# Altium footprint library Micro Switch.PcbLib: 75 footprints (part 1 of 5)
Each footprint in its own frame and in the unit in brackets; x right, y up, seen from the top. Pads: shape width x height; smd on the part's side, far side on the other; paste and mask are expansions set on the pad; w line width, h text height; cw(c..) or ccw(c..) is an arc to the next point about the centre after c.
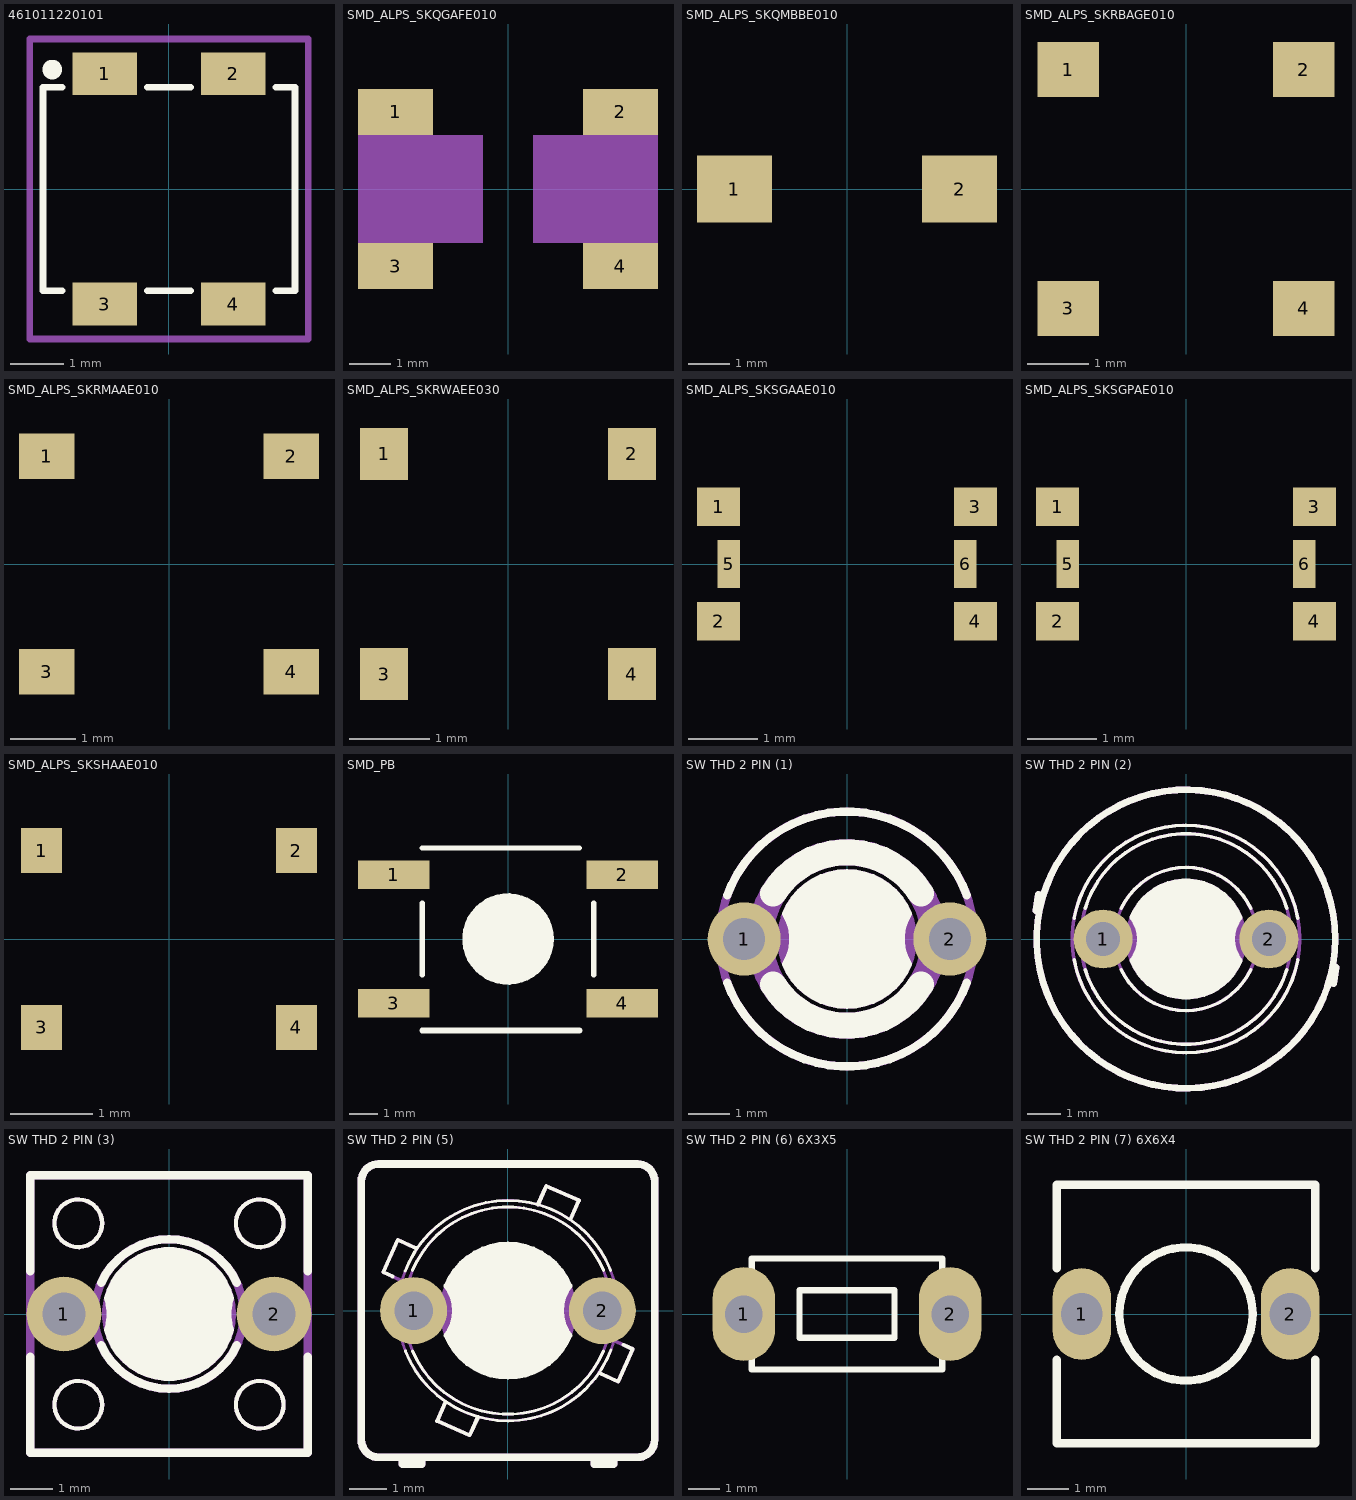
[diagram p0: the footprints below, top view; thin cyan lines are the x and y axes]

## 461011220101 [mm]
height 3.8
pads (4):
  rect 1.2x0.8 smd: 1(-1.2,2.15) 2(1.2,2.15) 3(-1.2,-2.15) 4(1.2,-2.15)
Top Overlay:
  circle w0.3: c-2.18,2.23 r0.032
  lines w0.127: -2,-1.9 -2.35,-1.9 -2.35,1.9 -2,1.9 ; -0.4,-1.9 0.4,-1.9 ; -0.4,1.9 0.4,1.9 ; 2,-1.9 2.35,-1.9 2.35,1.9 2,1.9
Mechanical 15:
  lines w0.127: -2.6,-2.8 2.6,-2.8 2.6,2.8 -2.6,2.8 -2.6,-2.8
3D body "461011220101.stp": height 3.8, standoff 0, extent -2.45,-2.35 2.45,2.35

## SMD_ALPS_SKQGAFE010 [mm]
height 1.5
pads (4):
  rect 1.8x1.1 smd mask-1.27: 1(-2.7,1.85) 2(2.7,1.85) 3(-2.7,-1.85) 4(2.7,-1.85)
Mechanical 9:
  rectangle: -3.6,-1.3 -0.6,1.3
  region: 3.6,1.3 0.6,1.3 0.6,-1.3 3.6,-1.3
3D body "SKQGAF.STEP": height 1.53, standoff 0.03, extent -3.2,-2.6 3.2,2.6

## SMD_ALPS_SKQMBBE010 [mm]
height 5
pads (2):
  rect 1.8x1.6 smd mask-1.27: 1(-2.7,0) 2(2.7,0)
3D body "SKQMBB.STEP": height 5.03, standoff 0.03, extent -3.15,-1.75 3.15,1.75

## SMD_ALPS_SKRBAGE010 [mm]
height 0.55
pads (4):
  rect 1x0.9 smd mask-1.27: 1(-1.925,1.95) 2(1.925,1.95) 3(-1.925,-1.95) 4(1.925,-1.95)
3D body "SKRBAG.STEP": height 0.55, standoff 0, extent -2.4,-2.4 2.4,2.4

## SMD_ALPS_SKRMAAE010 [mm]
height 0.4
pads (4):
  rect 0.85x0.7 smd mask-1.27: 1(-1.875,1.65) 2(1.875,1.65) 3(-1.875,-1.65) 4(1.875,-1.65)
3D body "SKRMAA.STEP": height 0.4, standoff 0, extent -2.25,-2.25 2.25,2.25

## SMD_ALPS_SKRWAEE030 [mm]
height 0.35
pads (4):
  rect 0.6x0.65 smd: 1(-1.55,1.375) 2(1.55,1.375) 3(-1.55,-1.375) 4(1.55,-1.375)
3D body "SKRWAE.STEP": height 0.38, standoff 0.03, extent -1.85,-1.85 1.85,1.85

## SMD_ALPS_SKSGAAE010 [mm]
height 1.4
pads (6):
  rect 0.625x0.56 smd: 1(-1.863,0.83) 2(-1.863,-0.83) 3(1.863,0.83) 4(1.863,-0.83)
  rect 0.325x0.7 smd: 5(-1.713,0) 6(1.713,0)
3D body "SKSGAA.STEP": height 1.4, standoff 0, extent -1.75,-1.387 1.75,1.387

## SMD_ALPS_SKSGPAE010 [mm]
height 1.4
pads (6):
  rect 0.625x0.56 smd: 1(-1.863,0.83) 2(-1.863,-0.83) 3(1.863,0.83) 4(1.863,-0.83)
  rect 0.325x0.7 smd: 5(-1.713,0) 6(1.713,0)
3D body "SKSGPA.STEP": height 1.4, standoff 0, extent -1.761,-1.387 1.761,1.387

## SMD_ALPS_SKSHAAE010 [mm]
height 0.379
pads (4):
  rect 0.5x0.55 smd: 1(-1.55,1.075) 2(1.55,1.075) 3(-1.55,-1.075) 4(1.55,-1.075)
3D body "SKSHAA.STEP": height 0.4, standoff 0.03, extent -1.716,-1.48 1.717,1.48

## SMD_PB [mm]
height 5
pads (4):
  rect 2.5x1 smd: 1(-3.992,2.25) 2(3.992,2.25) 3(-3.992,-2.25) 4(3.992,-2.25)
Top Overlay:
  circle w0.2: c0,0 r1.5
  region: 0,-1.5 -0.148,-1.5 -0.438,-1.442 -0.711,-1.329 -0.956,-1.165 -1.165,-0.956 -1.329,-0.711 -1.442,-0.438 -1.5,-0.148 -1.5,0 -1.5,0.148 -1.442,0.438 -1.329,0.711 -1.165,0.956 -0.956,1.165 -0.711,1.329 -0.438,1.442 -0.148,1.5 0,1.5 0.148,1.5 0.438,1.442 0.711,1.329 0.956,1.165 1.165,0.956 1.329,0.711 1.442,0.438 1.5,0.148 1.5,0 1.5,-0.148 1.442,-0.438 1.329,-0.711 1.165,-0.956 0.956,-1.165 0.711,-1.329 0.438,-1.442 0.148,-1.5
  lines w0.178: -2.997,3.175 2.503,3.175
  lines w0.2: -3,-1.25 -3,1.25 ; -2.997,-3.2 2.503,-3.2 ; 3,-1.25 3,1.25
3D body "SW3dPS-switch.STEP": height 5.03, standoff 0.03, extent -4.5,-3 4.5,3

## SW THD 2 PIN (1) [mil]
height 169.29
pads (2):
  round 70 hole 40 mask-50: 1(-98.43,0) 2(98.43,0)
Top Overlay:
  region: -60.35,-24.14 -57.33,-18.54 -53.79,-6.35 -53.79,6.35 -57.33,18.54 -60.35,24.14 -57.95,30.15 -50.87,40.98 -41.8,50.2 -31.08,57.45 -19.15,62.45 -6.47,65 6.47,65 19.15,62.45 31.08,57.45 41.8,50.2 50.87,40.98 57.95,30.15 60.35,24.14 57.33,18.54 53.79,6.35 53.79,-6.35 57.33,-18.54 60.35,-24.14 57.95,-30.15 50.87,-40.98 41.8,-50.2 31.08,-57.45 19.15,-62.45 6.47,-65 -6.47,-65 -19.15,-62.45 -31.08,-57.45 -41.8,-50.2 -50.87,-40.98 -57.95,-30.15
  lines w4: -60.35,-24.14 ccw(c0,0) 60.35,-24.14 cw(c98.43,0) 60.35,24.14 ccw(c0,0) -60.35,24.14 cw(c-98.43,0) -60.35,-24.14
  lines w8: -114.64,-41.69 ccw(c0,0) 114.64,-41.69 ; -114.64,41.69 cw(c0,0) 114.64,41.69
  lines w25: -70.71,-43.46 ccw(c0,0) 70.71,-43.46 ; -70.71,43.46 cw(c0,0) 70.71,43.46
Mechanical 3:
  circle w4: c0,0 r65
  circle w8: c0,0 r121.98
  circle w25: c0,0 r83
  region: 0,-65 -6.4,-65 -18.96,-62.5 -30.79,-57.6 -41.44,-50.49 -50.49,-41.44 -57.6,-30.79 -62.5,-18.96 -65,-6.4 -65,0 -65,6.4 -62.5,18.96 -57.6,30.79 -50.49,41.44 -41.44,50.49 -30.79,57.6 -18.96,62.5 -6.4,65 0,65 6.4,65 18.96,62.5 30.79,57.6 41.44,50.49 50.49,41.44 57.6,30.79 62.5,18.96 65,6.4 65,0 65,-6.4 62.5,-18.96 57.6,-30.79 50.49,-41.44 41.44,-50.49 30.79,-57.6 18.96,-62.5 6.4,-65
3D body "SKRGAA.STEP": height 170.29, standoff -136.8, extent -124.38,-122.01 124.4,122.03

## SW THD 2 PIN (2) [mil]
height 511.81
pads (2):
  round 70 hole 40 mask-50: 1(-98.43,0) 2(98.43,0)
Top Overlay:
  circle w8: c0,0 r177.17
  region: -65.2,-25.7 -63.2,-22.88 -59.93,-16.81 -57.7,-10.28 -56.57,-3.47 -56.56,3.42 -57.69,10.23 -59.91,16.76 -63.18,22.84 -65.17,25.66 -65.11,25.7 -62.54,32.2 -54.94,43.93 -45.17,53.93 -33.62,61.8 -20.74,67.22 -7.04,70 6.94,70 20.64,67.25 33.53,61.84 45.1,53.99 54.88,44.01 62.5,32.29 65.07,25.8 65.2,25.7 63.2,22.88 59.93,16.81 57.7,10.28 56.57,3.47 56.56,-3.42 57.69,-10.23 59.91,-16.76 63.18,-22.84 65.17,-25.66 65.11,-25.7 62.54,-32.2 54.94,-43.93 45.17,-53.93 33.62,-61.8 20.74,-67.22 7.04,-70 -6.94,-70 -20.64,-67.25 -33.53,-61.84 -45.1,-53.99 -54.88,-44.01 -62.5,-32.29 -65.07,-25.8
  lines w4: -132.8,24.28 cw(c0,0) 132.72,24.71 ; -132.72,-24.71 ccw(c0,0) 132.8,-24.28 ; -119.6,36.36 cw(c0,0) 119.56,36.47 ; -119.56,-36.47 ccw(c0,0) 119.6,-36.36 ; -76.92,-36.17 ccw(c0,0) 76.89,-36.24 ; -76.89,36.24 cw(c0,0) 76.92,36.17 ; -65.2,-25.7 ccw(c-98.43,0) -65.17,25.66 ; -65.11,25.7 cw(c0,0) 65.07,25.8 ; -65.07,-25.8 ccw(c0,0) 65.11,-25.7 ; 65.17,-25.66 cw(c98.43,0) 65.2,25.7
  lines w8: -174.02,32.84 -178,33.38 -175.2,53 -170.09,52.31 ; 170.09,-52.31 175.2,-53 178,-33.38 174.02,-32.84
Mechanical 3:
  circle w8: c0,0 r177.17
  circle w4: c0,0 r135
  circle w4: c0,0 r125
  circle w4: c0,0 r85
  circle w4: c0,0 r70
  region: 0,-70 -6.89,-70 -20.42,-67.31 -33.16,-62.03 -44.62,-54.37 -54.37,-44.62 -62.03,-33.16 -67.31,-20.42 -70,-6.89 -70,0 -70,6.89 -67.31,20.42 -62.03,33.16 -54.37,44.62 -44.62,54.37 -33.16,62.03 -20.42,67.31 -6.89,70 0,70 6.89,70 20.42,67.31 33.16,62.03 44.62,54.37 54.37,44.62 62.03,33.16 67.31,20.42 70,6.89 70,0 70,-6.89 67.31,-20.42 62.03,-33.16 54.37,-44.62 44.62,-54.37 33.16,-62.03 20.42,-67.31 6.89,-70
  lines w8: -174.02,32.84 -178,33.38 -175.2,53 -170.09,52.31 ; 170.09,-52.31 175.2,-53 178,-33.38 174.02,-32.84
3D body "SKRCAC.STEP": height 512.81, standoff -136.8, extent -177.82,-177.16 177.83,177.17

## SW THD 2 PIN (3) [mil]
height 374.02
pads (2):
  round 70 hole 40 mask-50: 1(-98.43,0) 2(98.43,0)
Top Overlay:
  circle w4: c-85,85 r22.36
  circle w4: c-85,-85 r22.36
  circle w4: c85,-85 r22.36
  circle w4: c85,85 r22.36
  region: -59.01,-14.75 -57.85,-11.17 -56.51,-3.76 -56.51,3.76 -57.85,11.17 -59.01,14.75 -57.37,21.3 -51.31,33.36 -42.75,43.79 -32.12,52.1 -19.92,57.87 -6.75,60.83 6.75,60.83 19.92,57.87 32.12,52.1 42.75,43.79 51.31,33.36 57.37,21.3 59.01,14.75 57.85,11.17 56.51,3.76 56.51,-3.76 57.85,-11.17 59.01,-14.75 57.37,-21.3 51.31,-33.36 42.75,-43.79 32.12,-52.1 19.92,-57.87 6.75,-60.83 -6.75,-60.83 -19.92,-57.87 -32.12,-52.1 -42.75,-43.79 -51.31,-33.36 -57.37,-21.3
  lines w4: -59.01,-14.75 ccw(c0,0) 59.01,-14.75 cw(c98.43,0) 59.01,14.75 ccw(c0,0) -59.01,14.75 cw(c-98.43,0) -59.01,-14.75
  lines w8: -130,-40 -129.91,-129.91 129.93,-129.91 130,-40 ; -130,40 -129.91,129.93 129.93,129.93 130,40 ; -63.56,-29.33 ccw(c0,0) 63.56,-29.33 ; -63.56,29.33 cw(c0,0) 63.56,29.33
Mechanical 3:
  circle w8: c0,0 r70
  circle w4: c0,0 r60.83
  circle w4: c-85,85 r22.36
  circle w4: c85,85 r22.36
  circle w4: c-85,-85 r22.36
  circle w4: c85,-85 r22.36
  region: 0,-60.83 -5.99,-60.83 -17.74,-58.49 -28.81,-53.9 -38.78,-47.25 -47.25,-38.78 -53.9,-28.81 -58.49,-17.74 -60.83,-5.99 -60.83,0 -60.83,5.99 -58.49,17.74 -53.9,28.81 -47.25,38.78 -38.78,47.25 -28.81,53.9 -17.74,58.49 -5.99,60.83 0,60.83 5.99,60.83 17.74,58.49 28.81,53.9 38.78,47.25 47.25,38.78 53.9,28.81 58.49,17.74 60.83,5.99 60.83,0 60.83,-5.99 58.49,-17.74 53.9,-28.81 47.25,-38.78 38.78,-47.25 28.81,-53.9 17.74,-58.49 5.99,-60.83
  lines w8: -129.91,-129.91 129.93,-129.91 129.93,129.93 -129.91,129.93 -129.91,-129.91
3D body "SKQKAJ.STEP": height 375.02, standoff -136.8, extent -129.91,-129.91 129.93,129.93

## SW THD 2 PIN (5) [mil]
height 216.54
pads (2):
  round 70 hole 40 mask-50: 1(-98.43,0) 2(98.43,0)
Top Overlay:
  region: -65.53,-26.11 -63.46,-23.26 -60.06,-17.1 -57.75,-10.45 -56.57,-3.52 -56.57,3.52 -57.75,10.45 -60.06,17.1 -63.46,23.26 -65.53,26.11 -64.67,26.79 -62.03,33.16 -54.37,44.62 -44.62,54.37 -33.16,62.03 -20.42,67.31 -6.89,70 6.89,70 20.42,67.31 33.16,62.03 44.62,54.37 54.37,44.62 62.03,33.16 64.67,26.79 65.53,26.11 63.46,23.26 60.06,17.1 57.75,10.45 56.57,3.52 56.57,-3.52 57.75,-10.46 60.06,-17.1 63.46,-23.26 65.53,-26.11 64.67,-26.79 62.03,-33.16 54.37,-44.62 44.62,-54.37 33.16,-62.03 20.42,-67.31 6.9,-70 -6.89,-70 -20.42,-67.31 -33.16,-62.03 -44.62,-54.37 -54.37,-44.62 -62.03,-33.16 -64.67,-26.79
  lines w3: -107.36,41.21 cw(c0,0) 107.13,41.82 ; -107.13,-41.82 ccw(c0,0) 107.36,-41.22 ; -99.69,-41.97 ccw(c0,0) 99.69,-41.98 ; -99.69,41.98 cw(c0,0) 99.69,41.97
  lines w4: -120.43,35.65 -130,40 -115,74 -95.86,65.3 ; -65.53,-26.11 ccw(c-98.43,0) -65.53,26.11 ; -65.3,-95.86 -74,-115 -40,-130 -31.3,-110.86 ; -64.67,-26.79 ccw(c0,0) 64.67,-26.79 ; -64.67,26.79 cw(c0,0) 64.67,26.79 ; 31.3,110.86 40,130 74,115 65.3,95.86 ; 65.53,-26.11 cw(c98.43,0) 65.53,26.11 ; 95.86,-65.3 115,-74 130,-40 120.43,-35.65
  lines w8: -110,-152.99 -110,-160 -90,-160 -90,-152.99 ; 90,-152.99 90,-160 110,-160 110,-152.99 ; 135,152.99 ccw(c134.99,152.99) 134.99,153 ; 135,152.99 cw(c135,134.99) 153,134.99 ccw(c153,134.97) 152.99,134.97 152.99,-135 cw(c134.99,-135) 134.99,-153 -135,-152.99 cw(c-135,-134.99) -153,-134.99 -152.99,135 cw(c-134.99,135) -134.99,153 134.99,153
Mechanical 3:
  circle w3: c0,0 r115
  circle w3: c0,0 r70
  circle w3: c0,0 r108.17
  region: -70,0 -70,-6.89 -67.31,-20.42 -62.03,-33.16 -54.37,-44.62 -44.62,-54.37 -33.16,-62.03 -20.42,-67.31 -6.89,-70 0,-70 6.89,-70 20.42,-67.31 33.16,-62.03 44.62,-54.37 54.37,-44.62 62.03,-33.16 67.31,-20.42 70,-6.89 70,0 70,6.89 67.31,20.42 62.03,33.16 54.37,44.62 44.62,54.37 33.16,62.03 20.42,67.31 6.89,70 0,70 -6.89,70 -20.42,67.31 -33.16,62.03 -44.62,54.37 -54.37,44.62 -62.03,33.16 -67.31,20.42 -70,6.89
  lines w4: -110.86,31.3 -130,40 -115,74 -95.86,65.3 ; -65.3,-95.86 -74,-115 -40,-130 -31.3,-110.86 ; 31.3,110.86 40,130 74,115 65.3,95.86 ; 95.86,-65.3 115,-74 130,-40 110.86,-31.3
  lines w8: -110,-152.99 -110,-160 -90,-160 -90,-152.99 ; 90,-152.99 90,-160 110,-160 110,-152.99 ; 135,152.99 cw(c135,134.99) 153,134.99 ccw(c153,134.97) 152.99,134.97 152.99,-135 cw(c134.99,-135) 134.99,-153 -135,-152.99 cw(c-135,-134.99) -153,-134.99 -152.99,135 cw(c-134.99,135) -134.99,153 134.99,153 ; 135,152.99 ccw(c134.99,152.99) 134.99,153
3D body "SKPDAC.STEP": height 217.54, standoff -136.8, extent -153.54,-161.41 153.55,153.55

## SW THD 2 PIN (6) 6X3X5 [mm]
pads (2):
  oval 2x3 hole 1.2 mask+0.1: 1(-3.3,0) 2(3.3,0)
Top Overlay:
  lines w0.2: -3.048,-1.778 3.048,-1.778 3.048,1.778 -3.048,1.778 -3.048,-1.778 ; -1.524,-0.762 1.524,-0.762 1.524,0.762 -1.524,0.762 -1.524,-0.762
3D body "43408.stp": height 4.3, standoff -3.5, extent -3.909,-1.75 3.91,1.75

## SW THD 2 PIN (7) 6X6X4 [mm]
height 4
pads (2):
  oval 1.4x2.2 hole 1 mask+0.1: 1(-2.5,0) 2(2.5,0)
Top Overlay:
  circle w0.2: c0,0 r1.6
  lines w0.2: -3.1,-1.1 -3.1,-3.1 3.1,-3.1 3.1,-1.1 ; -3.1,1.1 -3.1,3.1 3.1,3.1 3.1,1.1
3D body "Tactile Switch (6mm x 6mm_2pin.STEP": height 4.3, standoff -14, extent -3,-3 3,3.2